# Altium schematic symbol library Capacitor - Aluminium TH.SchLib: 4591 symbols (part 10 of 27) (continued)
## EGXF250ELL272MK25S (continued)
CAP MINI ALUM ELECTRO; Part Number: EGXF250ELL272MK25S; Manufacturer: United Chemi-Con; TemperatureRange: -40C ~ 125C; Tolerance: 20%; Voltage: 25V; Type: Polar; Ripple Current: 1.71A @ 120Hz; Value: 2700uF; PartId: 23770; Supplier 1: Digi-Key; Supplier Part Number 1: 565-4556-ND; ComponentLink1Description: Datasheet; ComponentLink1URL: http://www.chemi-con.co.jp/cgi-bin/CAT_DB/SEARCH/cat_db_al.cgi?e=e&j=p&pdfname=gxf; ComponentLink2Description: Digi-Key Listing; ComponentLink2URL: https://www.digikey.com/product-detail/en/united-chemi-con/EGXF250ELL272MK25S/565-4556-ND/6204404; Price: 1.91; Device Package: Radial, Can, 12.5mm
footprint CAP AL TH D12.5 L5 H26.5
pins: 1, 2

## EGXF250ELL682ML35S
designator C?, comment 6800uF  (value not drawn)
CAP MINI ALUM ELECTRO; Part Number: EGXF250ELL682ML35S; Manufacturer: United Chemi-Con; TemperatureRange: -40C ~ 125C; Tolerance: 20%; Voltage: 25V; Type: Polar; Ripple Current: 2.178A @ 120Hz; Value: 6800uF; PartId: 27441; Supplier 1: Digi-Key; Supplier Part Number 1: 565-4560-ND; ComponentLink1Description: Datasheet; ComponentLink1URL: http://www.chemi-con.co.jp/cgi-bin/CAT_DB/SEARCH/cat_db_al.cgi?e=e&j=p&pdfname=gxf; ComponentLink2Description: Digi-Key Listing; ComponentLink2URL: https://www.digikey.com/product-detail/en/united-chemi-con/EGXF250ELL682ML35S/565-4560-ND/6204417; Price: 3.44; Device Package: Radial, Can, 16mm
footprint CAP AL TH D16 L7.5 H37
pins: 1, 2

## EGXF250ELL751MJ16S
designator C?, comment 750uF  (value not drawn)
CAP MINI ALUM ELECTRO; Part Number: EGXF250ELL751MJ16S; Manufacturer: United Chemi-Con; TemperatureRange: -40C ~ 125C; Tolerance: 20%; Voltage: 25V; Type: Polar; Ripple Current: 780mA @ 120Hz; Value: 750uF; PartId: 25423; Supplier 1: Digi-Key; Supplier Part Number 1: 565-4561-ND; ComponentLink1Description: Datasheet; ComponentLink1URL: http://www.chemi-con.co.jp/cgi-bin/CAT_DB/SEARCH/cat_db_al.cgi?e=e&j=p&pdfname=gxf; ComponentLink2Description: Digi-Key Listing; ComponentLink2URL: https://www.digikey.com/product-detail/en/united-chemi-con/EGXF250ELL751MJ16S/565-4561-ND/6204394; Price: 1.02; Device Package: Radial, Can, 10mm
footprint CAP AL TH D10 L5 H17.5
pins: 1, 2

## EGXF251ELL240MJ20S
designator C?, comment 24uF  (value not drawn)
CAP MINI ALUM ELECTRO; Part Number: EGXF251ELL240MJ20S; Manufacturer: United Chemi-Con; TemperatureRange: -40C ~ 125C; Tolerance: 20%; Voltage: 250V; Type: Polar; Ripple Current: 270mA @ 120Hz; Value: 24uF; PartId: 25716; Supplier 1: Digi-Key; Supplier Part Number 1: 565-4565-ND; ComponentLink1Description: Datasheet; ComponentLink1URL: http://www.chemi-con.co.jp/cgi-bin/CAT_DB/SEARCH/cat_db_al.cgi?e=e&j=p&pdfname=gxf; ComponentLink2Description: Digi-Key Listing; ComponentLink2URL: https://www.digikey.com/product-detail/en/united-chemi-con/EGXF251ELL240MJ20S/565-4565-ND/6204578; Price: 1.25; Device Package: Radial, Can, 10mm
footprint CAP AL TH D10 L5 H22
pins: 1, 2

## EGXF251ELL300MJ25S
designator C?, comment 30uF  (value not drawn)
CAP MINI ALUM ELECTRO; Part Number: EGXF251ELL300MJ25S; Manufacturer: United Chemi-Con; TemperatureRange: -40C ~ 125C; Tolerance: 20%; Voltage: 250V; Type: Polar; Ripple Current: 360mA @ 120Hz; Value: 30uF; PartId: 26194; Supplier 1: Digi-Key; Supplier Part Number 1: 565-4566-ND; ComponentLink1Description: Datasheet; ComponentLink1URL: http://www.chemi-con.co.jp/cgi-bin/CAT_DB/SEARCH/cat_db_al.cgi?e=e&j=p&pdfname=gxf; ComponentLink2Description: Digi-Key Listing; ComponentLink2URL: https://www.digikey.com/product-detail/en/united-chemi-con/EGXF251ELL300MJ25S/565-4566-ND/6204579; Price: 1.45; Device Package: Radial, Can, 10mm
footprint CAP AL TH D10 L5 H30
pins: 1, 2

## EGXF251ELL360MK20S
designator C?, comment 36uF  (value not drawn)
CAP MINI ALUM ELECTRO; Part Number: EGXF251ELL360MK20S; Manufacturer: United Chemi-Con; TemperatureRange: -40C ~ 125C; Tolerance: 20%; Voltage: 250V; Type: Polar; Ripple Current: 427mA @ 120Hz; Value: 36uF; PartId: 23064; Supplier 1: Digi-Key; Supplier Part Number 1: 565-4567-ND; ComponentLink1Description: Datasheet; ComponentLink1URL: http://www.chemi-con.co.jp/cgi-bin/CAT_DB/SEARCH/cat_db_al.cgi?e=e&j=p&pdfname=gxf; ComponentLink2Description: Digi-Key Listing; ComponentLink2URL: https://www.digikey.com/product-detail/en/united-chemi-con/EGXF251ELL360MK20S/565-4567-ND/6204580; Price: 0; Device Package: Radial, Can, 12.5mm
footprint CAP AL TH D12.5 L5 H21.5
pins: 1, 2

## EGXF251ELL510MK25S
designator C?, comment 51uF  (value not drawn)
CAP MINI ALUM ELECTRO; Part Number: EGXF251ELL510MK25S; Manufacturer: United Chemi-Con; TemperatureRange: -40C ~ 125C; Tolerance: 20%; Voltage: 250V; Type: Polar; Ripple Current: 528.5mA @ 120Hz; Value: 51uF; PartId: 23762; Supplier 1: Digi-Key; Supplier Part Number 1: 565-4570-ND; ComponentLink1Description: Datasheet; ComponentLink1URL: http://www.chemi-con.co.jp/cgi-bin/CAT_DB/SEARCH/cat_db_al.cgi?e=e&j=p&pdfname=gxf; ComponentLink2Description: Digi-Key Listing; ComponentLink2URL: https://www.digikey.com/product-detail/en/united-chemi-con/EGXF251ELL510MK25S/565-4570-ND/6204583; Price: 1.78; Device Package: Radial, Can, 12.5mm
footprint CAP AL TH D12.5 L5 H26.5
pins: 1, 2

## EGXF251ELL620ML20S
designator C?, comment 62uF  (value not drawn)
CAP MINI ALUM ELECTRO; Part Number: EGXF251ELL620ML20S; Manufacturer: United Chemi-Con; TemperatureRange: -40C ~ 125C; Tolerance: 20%; Voltage: 250V; Type: Polar; Ripple Current: 525mA @ 120Hz; Value: 62uF; PartId: 26499; Supplier 1: Digi-Key; Supplier Part Number 1: 565-4572-ND; ComponentLink1Description: Datasheet; ComponentLink1URL: http://www.chemi-con.co.jp/cgi-bin/CAT_DB/SEARCH/cat_db_al.cgi?e=e&j=p&pdfname=gxf; ComponentLink2Description: Digi-Key Listing; ComponentLink2URL: https://www.digikey.com/product-detail/en/united-chemi-con/EGXF251ELL620ML20S/565-4572-ND/6204586; Price: 2.22; Device Package: Radial, Can, 16mm
footprint CAP AL TH D16 L7.5 H22
pins: 1, 2

## EGXF251ELL680MK30S
designator C?, comment 68uF  (value not drawn)
CAP MINI ALUM ELECTRO; Part Number: EGXF251ELL680MK30S; Manufacturer: United Chemi-Con; TemperatureRange: -40C ~ 125C; Tolerance: 20%; Voltage: 250V; Type: Polar; Ripple Current: 619.5mA @ 120Hz; Value: 68uF; PartId: 24418; Supplier 1: Digi-Key; Supplier Part Number 1: 565-4573-ND; ComponentLink1Description: Datasheet; ComponentLink1URL: http://www.chemi-con.co.jp/cgi-bin/CAT_DB/SEARCH/cat_db_al.cgi?e=e&j=p&pdfname=gxf; ComponentLink2Description: Digi-Key Listing; ComponentLink2URL: https://www.digikey.com/product-detail/en/united-chemi-con/EGXF251ELL680MK30S/565-4573-ND/6204587; Price: 2.21; Device Package: Radial, Can, 12.5mm
footprint CAP AL TH D12.5 L5 H35.5
pins: 1, 2

## EGXF251ELL910ML25S
designator C?, comment 91uF  (value not drawn)
CAP MINI ALUM ELECTRO; Part Number: EGXF251ELL910ML25S; Manufacturer: United Chemi-Con; TemperatureRange: -40C ~ 125C; Tolerance: 20%; Voltage: 250V; Type: Polar; Ripple Current: 647.5mA @ 120Hz; Value: 91uF; PartId: 26726; Supplier 1: Digi-Key; Supplier Part Number 1: 565-4576-ND; ComponentLink1Description: Datasheet; ComponentLink1URL: http://www.chemi-con.co.jp/cgi-bin/CAT_DB/SEARCH/cat_db_al.cgi?e=e&j=p&pdfname=gxf; ComponentLink2Description: Digi-Key Listing; ComponentLink2URL: https://www.digikey.com/product-detail/en/united-chemi-con/EGXF251ELL910ML25S/565-4576-ND/6204592; Price: 2.89; Device Package: Radial, Can, 16mm
footprint CAP AL TH D16 L7.5 H26.5
pins: 1, 2

## EGXF350ELL112MK20S
designator C?, comment 1100uF  (value not drawn)
CAP MINI ALUM ELECTRO; Part Number: EGXF350ELL112MK20S; Manufacturer: United Chemi-Con; TemperatureRange: -40C ~ 125C; Tolerance: 20%; Voltage: 35V; Type: Polar; Ripple Current: 954mA @ 120Hz; Value: 1100uF; PartId: 23063; Supplier 1: Digi-Key; Supplier Part Number 1: 565-4577-ND; ComponentLink1Description: Datasheet; ComponentLink1URL: http://www.chemi-con.co.jp/cgi-bin/CAT_DB/SEARCH/cat_db_al.cgi?e=e&j=p&pdfname=gxf; ComponentLink2Description: Digi-Key Listing; ComponentLink2URL: https://www.digikey.com/product-detail/en/united-chemi-con/EGXF350ELL112MK20S/565-4577-ND/6204428; Price: 0; Device Package: Radial, Can, 12.5mm
footprint CAP AL TH D12.5 L5 H21.5
pins: 1, 2

## EGXF350ELL112ML15S
designator C?, comment 1100uF  (value not drawn)
CAP MINI ALUM ELECTRO; Part Number: EGXF350ELL112ML15S; Manufacturer: United Chemi-Con; TemperatureRange: -40C ~ 125C; Tolerance: 20%; Voltage: 35V; Type: Polar; Ripple Current: 858mA @ 120Hz; Value: 1100uF; PartId: 26224; Supplier 1: Digi-Key; Supplier Part Number 1: 565-4578-ND; ComponentLink1Description: Datasheet; ComponentLink1URL: http://www.chemi-con.co.jp/cgi-bin/CAT_DB/SEARCH/cat_db_al.cgi?e=e&j=p&pdfname=gxf; ComponentLink2Description: Digi-Key Listing; ComponentLink2URL: https://www.digikey.com/product-detail/en/united-chemi-con/EGXF350ELL112ML15S/565-4578-ND/6204429; Price: 1.78; Device Package: Radial, Can, 16mm
footprint CAP AL TH D16 L7.5 H16.5
pins: 1, 2

## EGXF350ELL152MK25S
designator C?, comment 1500uF  (value not drawn)
CAP MINI ALUM ELECTRO; Part Number: EGXF350ELL152MK25S; Manufacturer: United Chemi-Con; TemperatureRange: -40C ~ 125C; Tolerance: 20%; Voltage: 35V; Type: Polar; Ripple Current: 1.368A @ 120Hz; Value: 1500uF; PartId: 23763; Supplier 1: Digi-Key; Supplier Part Number 1: 565-4580-ND; ComponentLink1Description: Datasheet; ComponentLink1URL: http://www.chemi-con.co.jp/cgi-bin/CAT_DB/SEARCH/cat_db_al.cgi?e=e&j=p&pdfname=gxf; ComponentLink2Description: Digi-Key Listing; ComponentLink2URL: https://www.digikey.com/product-detail/en/united-chemi-con/EGXF350ELL152MK25S/565-4580-ND/6204431; Price: 1.79; Device Package: Radial, Can, 12.5mm
footprint CAP AL TH D12.5 L5 H26.5
pins: 1, 2

## EGXF350ELL511MJ16S
designator C?, comment 510uF  (value not drawn)
CAP MINI ALUM ELECTRO; Part Number: EGXF350ELL511MJ16S; Manufacturer: United Chemi-Con; TemperatureRange: -40C ~ 125C; Tolerance: 20%; Voltage: 35V; Type: Polar; Ripple Current: 650mA @ 120Hz; Value: 510uF; PartId: 25426; Supplier 1: Digi-Key; Supplier Part Number 1: 565-4584-ND; ComponentLink1Description: Datasheet; ComponentLink1URL: http://www.chemi-con.co.jp/cgi-bin/CAT_DB/SEARCH/cat_db_al.cgi?e=e&j=p&pdfname=gxf; ComponentLink2Description: Digi-Key Listing; ComponentLink2URL: https://www.digikey.com/product-detail/en/united-chemi-con/EGXF350ELL511MJ16S/565-4584-ND/6204423; Price: 1.09; Device Package: Radial, Can, 10mm
footprint CAP AL TH D10 L5 H17.5
pins: 1, 2

## EGXF350ELL681MJ20S
designator C?, comment 680uF  (value not drawn)
CAP MINI ALUM ELECTRO; Part Number: EGXF350ELL681MJ20S; Manufacturer: United Chemi-Con; TemperatureRange: -40C ~ 125C; Tolerance: 20%; Voltage: 35V; Type: Polar; Ripple Current: 924mA @ 120Hz; Value: 680uF; PartId: 25717; Supplier 1: Digi-Key; Supplier Part Number 1: 565-4586-ND; ComponentLink1Description: Datasheet; ComponentLink1URL: http://www.chemi-con.co.jp/cgi-bin/CAT_DB/SEARCH/cat_db_al.cgi?e=e&j=p&pdfname=gxf; ComponentLink2Description: Digi-Key Listing; ComponentLink2URL: https://www.digikey.com/product-detail/en/united-chemi-con/EGXF350ELL681MJ20S/565-4586-ND/6204425; Price: 1.3; Device Package: Radial, Can, 10mm
footprint CAP AL TH D10 L5 H22
pins: 1, 2

## EGXF350ELL821MJ25S
designator C?, comment 820uF  (value not drawn)
CAP MINI ALUM ELECTRO; Part Number: EGXF350ELL821MJ25S; Manufacturer: United Chemi-Con; TemperatureRange: -40C ~ 125C; Tolerance: 20%; Voltage: 35V; Type: Polar; Ripple Current: 1.128A @ 120Hz; Value: 820uF; PartId: 26191; Supplier 1: Digi-Key; Supplier Part Number 1: 565-4587-ND; ComponentLink1Description: Datasheet; ComponentLink1URL: http://www.chemi-con.co.jp/cgi-bin/CAT_DB/SEARCH/cat_db_al.cgi?e=e&j=p&pdfname=gxf; ComponentLink2Description: Digi-Key Listing; ComponentLink2URL: https://www.digikey.com/product-detail/en/united-chemi-con/EGXF350ELL821MJ25S/565-4587-ND/6204427; Price: 1.36; Device Package: Radial, Can, 10mm
footprint CAP AL TH D10 L5 H30
pins: 1, 2

## EGXF351ELL240MK20S
designator C?, comment 24uF  (value not drawn)
CAP MINI ALUM ELECTRO; Part Number: EGXF351ELL240MK20S; Manufacturer: United Chemi-Con; TemperatureRange: -40C ~ 125C; Tolerance: 20%; Voltage: 350V; Type: Polar; Ripple Current: 204mA @ 120Hz; Value: 24uF; PartId: 23066; Supplier 1: Digi-Key; Supplier Part Number 1: 565-4588-ND; ComponentLink1Description: Datasheet; ComponentLink1URL: http://www.chemi-con.co.jp/cgi-bin/CAT_DB/SEARCH/cat_db_al.cgi?e=e&j=p&pdfname=gxf; ComponentLink2Description: Digi-Key Listing; ComponentLink2URL: https://www.digikey.com/product-detail/en/united-chemi-con/EGXF351ELL240MK20S/565-4588-ND/6204599; Price: 0; Device Package: Radial, Can, 12.5mm
footprint CAP AL TH D12.5 L5 H21.5
pins: 1, 2

## EGXF351ELL470MK30S
designator C?, comment 47uF  (value not drawn)
CAP MINI ALUM ELECTRO; Part Number: EGXF351ELL470MK30S; Manufacturer: United Chemi-Con; TemperatureRange: -40C ~ 125C; Tolerance: 20%; Voltage: 350V; Type: Polar; Ripple Current: 423.5mA @ 120Hz; Value: 47uF; PartId: 24427; Supplier 1: Digi-Key; Supplier Part Number 1: 565-4592-ND; ComponentLink1Description: Datasheet; ComponentLink1URL: http://www.chemi-con.co.jp/cgi-bin/CAT_DB/SEARCH/cat_db_al.cgi?e=e&j=p&pdfname=gxf; ComponentLink2Description: Digi-Key Listing; ComponentLink2URL: https://www.digikey.com/product-detail/en/united-chemi-con/EGXF351ELL470MK30S/565-4592-ND/6204606; Price: 2.46; Device Package: Radial, Can, 12.5mm
footprint CAP AL TH D12.5 L5 H35.5
pins: 1, 2

## EGXF351ELL560ML25S
designator C?, comment 56uF  (value not drawn)
CAP MINI ALUM ELECTRO; Part Number: EGXF351ELL560ML25S; Manufacturer: United Chemi-Con; TemperatureRange: -40C ~ 125C; Tolerance: 20%; Voltage: 350V; Type: Polar; Ripple Current: 395.5mA @ 120Hz; Value: 56uF; PartId: 26725; Supplier 1: Digi-Key; Supplier Part Number 1: 565-4594-ND; ComponentLink1Description: Datasheet; ComponentLink1URL: http://www.chemi-con.co.jp/cgi-bin/CAT_DB/SEARCH/cat_db_al.cgi?e=e&j=p&pdfname=gxf; ComponentLink2Description: Digi-Key Listing; ComponentLink2URL: https://www.digikey.com/product-detail/en/united-chemi-con/EGXF351ELL560ML25S/565-4594-ND/6204609; Price: 2.83; Device Package: Radial, Can, 16mm
footprint CAP AL TH D16 L7.5 H26.5
pins: 1, 2

## EGXF401ELL120MJ20S
designator C?, comment 12uF  (value not drawn)
CAP MINI ALUM ELECTRO; Part Number: EGXF401ELL120MJ20S; Manufacturer: United Chemi-Con; TemperatureRange: -40C ~ 125C; Tolerance: 20%; Voltage: 400V; Type: Polar; Ripple Current: 138mA @ 120Hz; Value: 12uF; PartId: 25718; Supplier 1: Digi-Key; Supplier Part Number 1: 565-4599-ND; ComponentLink1Description: Datasheet; ComponentLink1URL: http://www.chemi-con.co.jp/cgi-bin/CAT_DB/SEARCH/cat_db_al.cgi?e=e&j=p&pdfname=gxf; ComponentLink2Description: Digi-Key Listing; ComponentLink2URL: https://www.digikey.com/product-detail/en/united-chemi-con/EGXF401ELL120MJ20S/565-4599-ND/6204616; Price: 1.31; Device Package: Radial, Can, 10mm
footprint CAP AL TH D10 L5 H22
pins: 1, 2

## EGXF401ELL160MJ25S
designator C?, comment 16uF  (value not drawn)
CAP MINI ALUM ELECTRO; Part Number: EGXF401ELL160MJ25S; Manufacturer: United Chemi-Con; TemperatureRange: -40C ~ 125C; Tolerance: 20%; Voltage: 400V; Type: Polar; Ripple Current: 183mA @ 120Hz; Value: 16uF; PartId: 26195; Supplier 1: Digi-Key; Supplier Part Number 1: 565-4600-ND; ComponentLink1Description: Datasheet; ComponentLink1URL: http://www.chemi-con.co.jp/cgi-bin/CAT_DB/SEARCH/cat_db_al.cgi?e=e&j=p&pdfname=gxf; ComponentLink2Description: Digi-Key Listing; ComponentLink2URL: https://www.digikey.com/product-detail/en/united-chemi-con/EGXF401ELL160MJ25S/565-4600-ND/6204617; Price: 1.46; Device Package: Radial, Can, 10mm
footprint CAP AL TH D10 L5 H30
pins: 1, 2

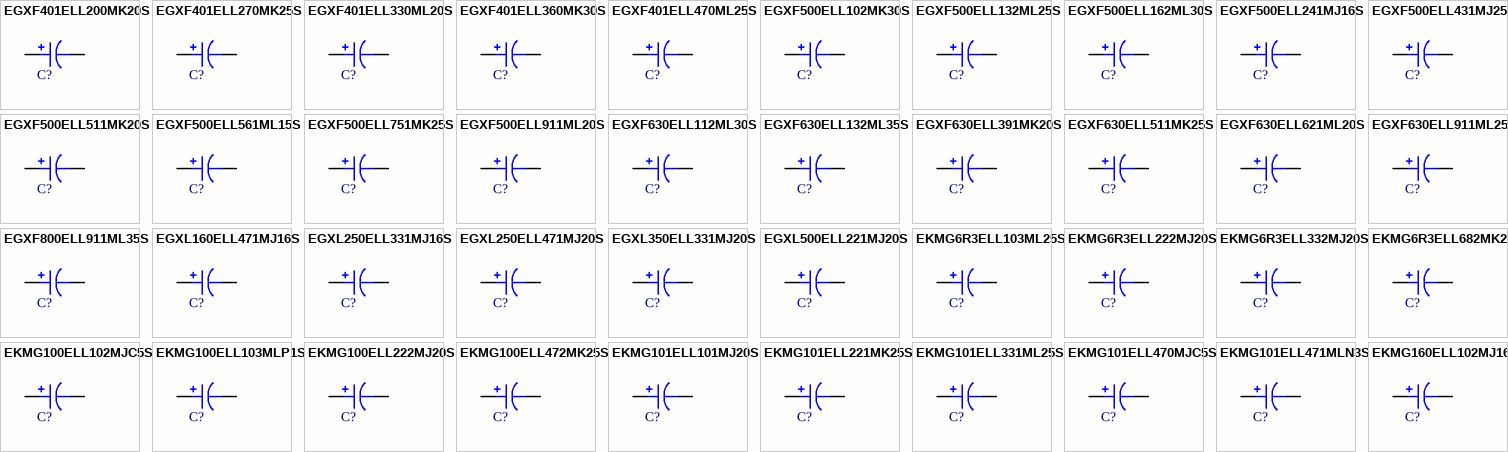
[diagram p40: symbols EGXF401ELL200MK20S to EKMG160ELL102MJ16S]

## EGXF401ELL200MK20S
designator C?, comment 20uF  (value not drawn)
CAP MINI ALUM ELECTRO; Part Number: EGXF401ELL200MK20S; Manufacturer: United Chemi-Con; TemperatureRange: -40C ~ 125C; Tolerance: 20%; Voltage: 400V; Type: Polar; Ripple Current: 204mA @ 120Hz; Value: 20uF; PartId: 23071; Supplier 1: Digi-Key; Supplier Part Number 1: 565-4602-ND; ComponentLink1Description: Datasheet; ComponentLink1URL: http://www.chemi-con.co.jp/cgi-bin/CAT_DB/SEARCH/cat_db_al.cgi?e=e&j=p&pdfname=gxf; ComponentLink2Description: Digi-Key Listing; ComponentLink2URL: https://www.digikey.com/product-detail/en/united-chemi-con/EGXF401ELL200MK20S/565-4602-ND/6204619; Price: 0; Device Package: Radial, Can, 12.5mm
footprint CAP AL TH D12.5 L5 H21.5
pins: 1, 2

## EGXF401ELL270MK25S
designator C?, comment 27uF  (value not drawn)
CAP MINI ALUM ELECTRO; Part Number: EGXF401ELL270MK25S; Manufacturer: United Chemi-Con; TemperatureRange: -40C ~ 125C; Tolerance: 20%; Voltage: 400V; Type: Polar; Ripple Current: 294mA @ 120Hz; Value: 27uF; PartId: 23771; Supplier 1: Digi-Key; Supplier Part Number 1: 565-4605-ND; ComponentLink1Description: Datasheet; ComponentLink1URL: http://www.chemi-con.co.jp/cgi-bin/CAT_DB/SEARCH/cat_db_al.cgi?e=e&j=p&pdfname=gxf; ComponentLink2Description: Digi-Key Listing; ComponentLink2URL: https://www.digikey.com/product-detail/en/united-chemi-con/EGXF401ELL270MK25S/565-4605-ND/6204622; Price: 1.92; Device Package: Radial, Can, 12.5mm
footprint CAP AL TH D12.5 L5 H26.5
pins: 1, 2

## EGXF401ELL330ML20S
designator C?, comment 33uF  (value not drawn)
CAP MINI ALUM ELECTRO; Part Number: EGXF401ELL330ML20S; Manufacturer: United Chemi-Con; TemperatureRange: -40C ~ 125C; Tolerance: 20%; Voltage: 400V; Type: Polar; Ripple Current: 291mA @ 120Hz; Value: 33uF; PartId: 26507; Supplier 1: Digi-Key; Supplier Part Number 1: 565-4607-ND; ComponentLink1Description: Datasheet; ComponentLink1URL: http://www.chemi-con.co.jp/cgi-bin/CAT_DB/SEARCH/cat_db_al.cgi?e=e&j=p&pdfname=gxf; ComponentLink2Description: Digi-Key Listing; ComponentLink2URL: https://www.digikey.com/product-detail/en/united-chemi-con/EGXF401ELL330ML20S/565-4607-ND/6204624; Price: 2.52; Device Package: Radial, Can, 16mm
footprint CAP AL TH D16 L7.5 H22
pins: 1, 2

## EGXF401ELL360MK30S
designator C?, comment 36uF  (value not drawn)
CAP MINI ALUM ELECTRO; Part Number: EGXF401ELL360MK30S; Manufacturer: United Chemi-Con; TemperatureRange: -40C ~ 125C; Tolerance: 20%; Voltage: 400V; Type: Polar; Ripple Current: 423.5mA @ 120Hz; Value: 36uF; PartId: 24422; Supplier 1: Digi-Key; Supplier Part Number 1: 565-4608-ND; ComponentLink1Description: Datasheet; ComponentLink1URL: http://www.chemi-con.co.jp/cgi-bin/CAT_DB/SEARCH/cat_db_al.cgi?e=e&j=p&pdfname=gxf; ComponentLink2Description: Digi-Key Listing; ComponentLink2URL: https://www.digikey.com/product-detail/en/united-chemi-con/EGXF401ELL360MK30S/565-4608-ND/6204625; Price: 2.35; Device Package: Radial, Can, 12.5mm
footprint CAP AL TH D12.5 L5 H35.5
pins: 1, 2

## EGXF401ELL470ML25S
designator C?, comment 47uF  (value not drawn)
CAP MINI ALUM ELECTRO; Part Number: EGXF401ELL470ML25S; Manufacturer: United Chemi-Con; TemperatureRange: -40C ~ 125C; Tolerance: 20%; Voltage: 400V; Type: Polar; Ripple Current: 395.5mA @ 120Hz; Value: 47uF; PartId: 26729; Supplier 1: Digi-Key; Supplier Part Number 1: 565-4612-ND; ComponentLink1Description: Datasheet; ComponentLink1URL: http://www.chemi-con.co.jp/cgi-bin/CAT_DB/SEARCH/cat_db_al.cgi?e=e&j=p&pdfname=gxf; ComponentLink2Description: Digi-Key Listing; ComponentLink2URL: https://www.digikey.com/product-detail/en/united-chemi-con/EGXF401ELL470ML25S/565-4612-ND/6204630; Price: 3.02; Device Package: Radial, Can, 16mm
footprint CAP AL TH D16 L7.5 H26.5
pins: 1, 2

## EGXF500ELL102MK30S
designator C?, comment 1000uF  (value not drawn)
CAP MINI ALUM ELECTRO; Part Number: EGXF500ELL102MK30S; Manufacturer: United Chemi-Con; TemperatureRange: -40C ~ 125C; Tolerance: 20%; Voltage: 50V; Type: Polar; Ripple Current: 1.506A @ 120Hz; Value: 1000uF; PartId: 24416; Supplier 1: Digi-Key; Supplier Part Number 1: 565-4618-ND; ComponentLink1Description: Datasheet; ComponentLink1URL: http://www.chemi-con.co.jp/cgi-bin/CAT_DB/SEARCH/cat_db_al.cgi?e=e&j=p&pdfname=gxf; ComponentLink2Description: Digi-Key Listing; ComponentLink2URL: https://www.digikey.com/product-detail/en/united-chemi-con/EGXF500ELL102MK30S/565-4618-ND/6204464; Price: 2.14; Device Package: Radial, Can, 12.5mm
footprint CAP AL TH D12.5 L5 H35.5
pins: 1, 2

## EGXF500ELL132ML25S
designator C?, comment 1300uF  (value not drawn)
CAP MINI ALUM ELECTRO; Part Number: EGXF500ELL132ML25S; Manufacturer: United Chemi-Con; TemperatureRange: -40C ~ 125C; Tolerance: 20%; Voltage: 50V; Type: Polar; Ripple Current: 1.614A @ 120Hz; Value: 1300uF; PartId: 26719; Supplier 1: Digi-Key; Supplier Part Number 1: 565-4621-ND; ComponentLink1Description: Datasheet; ComponentLink1URL: http://www.chemi-con.co.jp/cgi-bin/CAT_DB/SEARCH/cat_db_al.cgi?e=e&j=p&pdfname=gxf; ComponentLink2Description: Digi-Key Listing; ComponentLink2URL: https://www.digikey.com/product-detail/en/united-chemi-con/EGXF500ELL132ML25S/565-4621-ND/6204469; Price: 2.71; Device Package: Radial, Can, 16mm
footprint CAP AL TH D16 L7.5 H26.5
pins: 1, 2

## EGXF500ELL162ML30S
designator C?, comment 1600uF  (value not drawn)
CAP MINI ALUM ELECTRO; Part Number: EGXF500ELL162ML30S; Manufacturer: United Chemi-Con; TemperatureRange: -40C ~ 125C; Tolerance: 20%; Voltage: 50V; Type: Polar; Ripple Current: 1.89A @ 120Hz; Value: 1600uF; PartId: 27275; Supplier 1: Digi-Key; Supplier Part Number 1: 565-4622-ND; ComponentLink1Description: Datasheet; ComponentLink1URL: http://www.chemi-con.co.jp/cgi-bin/CAT_DB/SEARCH/cat_db_al.cgi?e=e&j=p&pdfname=gxf; ComponentLink2Description: Digi-Key Listing; ComponentLink2URL: https://www.digikey.com/product-detail/en/united-chemi-con/EGXF500ELL162ML30S/565-4622-ND/6204472; Price: 3.12; Device Package: Radial, Can, 16mm
footprint CAP AL TH D16 L7.5 H33.5
pins: 1, 2

## EGXF500ELL241MJ16S
designator C?, comment 240uF  (value not drawn)
CAP MINI ALUM ELECTRO; Part Number: EGXF500ELL241MJ16S; Manufacturer: United Chemi-Con; TemperatureRange: -40C ~ 125C; Tolerance: 20%; Voltage: 50V; Type: Polar; Ripple Current: 432mA @ 120Hz; Value: 240uF; PartId: 25417; Supplier 1: Digi-Key; Supplier Part Number 1: 565-4625-ND; ComponentLink1Description: Datasheet; ComponentLink1URL: http://www.chemi-con.co.jp/cgi-bin/CAT_DB/SEARCH/cat_db_al.cgi?e=e&j=p&pdfname=gxf; ComponentLink2Description: Digi-Key Listing; ComponentLink2URL: https://www.digikey.com/product-detail/en/united-chemi-con/EGXF500ELL241MJ16S/565-4625-ND/6204452; Price: 0.98; Device Package: Radial, Can, 10mm
footprint CAP AL TH D10 L5 H17.5
pins: 1, 2

## EGXF500ELL431MJ25S
designator C?, comment 430uF  (value not drawn)
CAP MINI ALUM ELECTRO; Part Number: EGXF500ELL431MJ25S; Manufacturer: United Chemi-Con; TemperatureRange: -40C ~ 125C; Tolerance: 20%; Voltage: 50V; Type: Polar; Ripple Current: 870mA @ 120Hz; Value: 430uF; PartId: 26192; Supplier 1: Digi-Key; Supplier Part Number 1: 565-4629-ND; ComponentLink1Description: Datasheet; ComponentLink1URL: http://www.chemi-con.co.jp/cgi-bin/CAT_DB/SEARCH/cat_db_al.cgi?e=e&j=p&pdfname=gxf; ComponentLink2Description: Digi-Key Listing; ComponentLink2URL: https://www.digikey.com/product-detail/en/united-chemi-con/EGXF500ELL431MJ25S/565-4629-ND/6204456; Price: 1.38; Device Package: Radial, Can, 10mm
footprint CAP AL TH D10 L5 H30
pins: 1, 2

## EGXF500ELL511MK20S
designator C?, comment 510uF  (value not drawn)
CAP MINI ALUM ELECTRO; Part Number: EGXF500ELL511MK20S; Manufacturer: United Chemi-Con; TemperatureRange: -40C ~ 125C; Tolerance: 20%; Voltage: 50V; Type: Polar; Ripple Current: 705mA @ 120Hz; Value: 510uF; PartId: 23060; Supplier 1: Digi-Key; Supplier Part Number 1: 565-4630-ND; ComponentLink1Description: Datasheet; ComponentLink1URL: http://www.chemi-con.co.jp/cgi-bin/CAT_DB/SEARCH/cat_db_al.cgi?e=e&j=p&pdfname=gxf; ComponentLink2Description: Digi-Key Listing; ComponentLink2URL: https://www.digikey.com/product-detail/en/united-chemi-con/EGXF500ELL511MK20S/565-4630-ND/6204457; Price: 0; Device Package: Radial, Can, 12.5mm
footprint CAP AL TH D12.5 L5 H21.5
pins: 1, 2

## EGXF500ELL561ML15S
designator C?, comment 560uF  (value not drawn)
CAP MINI ALUM ELECTRO; Part Number: EGXF500ELL561ML15S; Manufacturer: United Chemi-Con; TemperatureRange: -40C ~ 125C; Tolerance: 20%; Voltage: 50V; Type: Polar; Ripple Current: 595mA @ 120Hz; Value: 560uF; PartId: 26223; Supplier 1: Digi-Key; Supplier Part Number 1: 565-4632-ND; ComponentLink1Description: Datasheet; ComponentLink1URL: http://www.chemi-con.co.jp/cgi-bin/CAT_DB/SEARCH/cat_db_al.cgi?e=e&j=p&pdfname=gxf; ComponentLink2Description: Digi-Key Listing; ComponentLink2URL: https://www.digikey.com/product-detail/en/united-chemi-con/EGXF500ELL561ML15S/565-4632-ND/6204459; Price: 1.71; Device Package: Radial, Can, 16mm
footprint CAP AL TH D16 L7.5 H16.5
pins: 1, 2

## EGXF500ELL751MK25S
designator C?, comment 750uF  (value not drawn)
CAP MINI ALUM ELECTRO; Part Number: EGXF500ELL751MK25S; Manufacturer: United Chemi-Con; TemperatureRange: -40C ~ 125C; Tolerance: 20%; Voltage: 50V; Type: Polar; Ripple Current: 1.218A @ 120Hz; Value: 750uF; PartId: 23749; Supplier 1: Digi-Key; Supplier Part Number 1: 565-4633-ND; ComponentLink1Description: Datasheet; ComponentLink1URL: http://www.chemi-con.co.jp/cgi-bin/CAT_DB/SEARCH/cat_db_al.cgi?e=e&j=p&pdfname=gxf; ComponentLink2Description: Digi-Key Listing; ComponentLink2URL: https://www.digikey.com/product-detail/en/united-chemi-con/EGXF500ELL751MK25S/565-4633-ND/6204461; Price: 1.72; Device Package: Radial, Can, 12.5mm
footprint CAP AL TH D12.5 L5 H26.5
pins: 1, 2

## EGXF500ELL911ML20S
designator C?, comment 910uF  (value not drawn)
CAP MINI ALUM ELECTRO; Part Number: EGXF500ELL911ML20S; Manufacturer: United Chemi-Con; TemperatureRange: -40C ~ 125C; Tolerance: 20%; Voltage: 50V; Type: Polar; Ripple Current: 1.044A @ 120Hz; Value: 910uF; PartId: 26497; Supplier 1: Digi-Key; Supplier Part Number 1: 565-4635-ND; ComponentLink1Description: Datasheet; ComponentLink1URL: http://www.chemi-con.co.jp/cgi-bin/CAT_DB/SEARCH/cat_db_al.cgi?e=e&j=p&pdfname=gxf; ComponentLink2Description: Digi-Key Listing; ComponentLink2URL: https://www.digikey.com/product-detail/en/united-chemi-con/EGXF500ELL911ML20S/565-4635-ND/6204463; Price: 2.2; Device Package: Radial, Can, 16mm
footprint CAP AL TH D16 L7.5 H22
pins: 1, 2

## EGXF630ELL112ML30S
designator C?, comment 1100uF  (value not drawn)
CAP MINI ALUM ELECTRO; Part Number: EGXF630ELL112ML30S; Manufacturer: United Chemi-Con; TemperatureRange: -40C ~ 125C; Tolerance: 20%; Voltage: 63V; Type: Polar; Ripple Current: 1.764A @ 120Hz; Value: 1100uF; PartId: 27282; Supplier 1: Digi-Key; Supplier Part Number 1: 565-4636-ND; ComponentLink1Description: Datasheet; ComponentLink1URL: http://www.chemi-con.co.jp/cgi-bin/CAT_DB/SEARCH/cat_db_al.cgi?e=e&j=p&pdfname=gxf; ComponentLink2Description: Digi-Key Listing; ComponentLink2URL: https://www.digikey.com/product-detail/en/united-chemi-con/EGXF630ELL112ML30S/565-4636-ND/6204492; Price: 3.2; Device Package: Radial, Can, 16mm
footprint CAP AL TH D16 L7.5 H33.5
pins: 1, 2

## EGXF630ELL132ML35S
designator C?, comment 1300uF  (value not drawn)
CAP MINI ALUM ELECTRO; Part Number: EGXF630ELL132ML35S; Manufacturer: United Chemi-Con; TemperatureRange: -40C ~ 125C; Tolerance: 20%; Voltage: 63V; Type: Polar; Ripple Current: 1.932A @ 120Hz; Value: 1300uF; PartId: 27438; Supplier 1: Digi-Key; Supplier Part Number 1: 565-4638-ND; ComponentLink1Description: Datasheet; ComponentLink1URL: http://www.chemi-con.co.jp/cgi-bin/CAT_DB/SEARCH/cat_db_al.cgi?e=e&j=p&pdfname=gxf; ComponentLink2Description: Digi-Key Listing; ComponentLink2URL: https://www.digikey.com/product-detail/en/united-chemi-con/EGXF630ELL132ML35S/565-4638-ND/6204495; Price: 3.35; Device Package: Radial, Can, 16mm
footprint CAP AL TH D16 L7.5 H37
pins: 1, 2

## EGXF630ELL391MK20S
designator C?, comment 390uF  (value not drawn)
CAP MINI ALUM ELECTRO; Part Number: EGXF630ELL391MK20S; Manufacturer: United Chemi-Con; TemperatureRange: -40C ~ 125C; Tolerance: 20%; Voltage: 63V; Type: Polar; Ripple Current: 655mA @ 120Hz; Value: 390uF; PartId: 23065; Supplier 1: Digi-Key; Supplier Part Number 1: 565-4641-ND; ComponentLink1Description: Datasheet; ComponentLink1URL: http://www.chemi-con.co.jp/cgi-bin/CAT_DB/SEARCH/cat_db_al.cgi?e=e&j=p&pdfname=gxf; ComponentLink2Description: Digi-Key Listing; ComponentLink2URL: https://www.digikey.com/product-detail/en/united-chemi-con/EGXF630ELL391MK20S/565-4641-ND/6204480; Price: 0; Device Package: Radial, Can, 12.5mm
footprint CAP AL TH D12.5 L5 H21.5
pins: 1, 2

## EGXF630ELL511MK25S
designator C?, comment 510uF  (value not drawn)
CAP MINI ALUM ELECTRO; Part Number: EGXF630ELL511MK25S; Manufacturer: United Chemi-Con; TemperatureRange: -40C ~ 125C; Tolerance: 20%; Voltage: 63V; Type: Polar; Ripple Current: 940mA @ 120Hz; Value: 510uF; PartId: 23755; Supplier 1: Digi-Key; Supplier Part Number 1: 565-4642-ND; ComponentLink1Description: Datasheet; ComponentLink1URL: http://www.chemi-con.co.jp/cgi-bin/CAT_DB/SEARCH/cat_db_al.cgi?e=e&j=p&pdfname=gxf; ComponentLink2Description: Digi-Key Listing; ComponentLink2URL: https://www.digikey.com/product-detail/en/united-chemi-con/EGXF630ELL511MK25S/565-4642-ND/6204481; Price: 1.74; Device Package: Radial, Can, 12.5mm
footprint CAP AL TH D12.5 L5 H26.5
pins: 1, 2

## EGXF630ELL621ML20S
designator C?, comment 620uF  (value not drawn)
CAP MINI ALUM ELECTRO; Part Number: EGXF630ELL621ML20S; Manufacturer: United Chemi-Con; TemperatureRange: -40C ~ 125C; Tolerance: 20%; Voltage: 63V; Type: Polar; Ripple Current: 978mA @ 120Hz; Value: 620uF; PartId: 26495; Supplier 1: Digi-Key; Supplier Part Number 1: 565-4643-ND; ComponentLink1Description: Datasheet; ComponentLink1URL: http://www.chemi-con.co.jp/cgi-bin/CAT_DB/SEARCH/cat_db_al.cgi?e=e&j=p&pdfname=gxf; ComponentLink2Description: Digi-Key Listing; ComponentLink2URL: https://www.digikey.com/product-detail/en/united-chemi-con/EGXF630ELL621ML20S/565-4643-ND/6204483; Price: 2.18; Device Package: Radial, Can, 16mm
footprint CAP AL TH D16 L7.5 H22
pins: 1, 2

## EGXF630ELL911ML25S
designator C?, comment 910uF  (value not drawn)
CAP MINI ALUM ELECTRO; Part Number: EGXF630ELL911ML25S; Manufacturer: United Chemi-Con; TemperatureRange: -40C ~ 125C; Tolerance: 20%; Voltage: 63V; Type: Polar; Ripple Current: 1.38A @ 120Hz; Value: 910uF; PartId: 26724; Supplier 1: Digi-Key; Supplier Part Number 1: 565-4646-ND; ComponentLink1Description: Datasheet; ComponentLink1URL: http://www.chemi-con.co.jp/cgi-bin/CAT_DB/SEARCH/cat_db_al.cgi?e=e&j=p&pdfname=gxf; ComponentLink2Description: Digi-Key Listing; ComponentLink2URL: https://www.digikey.com/product-detail/en/united-chemi-con/EGXF630ELL911ML25S/565-4646-ND/6204489; Price: 2.81; Device Package: Radial, Can, 16mm
footprint CAP AL TH D16 L7.5 H26.5
pins: 1, 2

## EGXF800ELL911ML35S
designator C?, comment 910uF  (value not drawn)